# Altium footprint library NXP_60_26022015.PCBLIB: 287 footprints (part 14 of 18)
Each footprint in its own frame and in the unit in brackets; x right, y up, seen from the top. Pads: shape width x height; smd on the part's side, far side on the other; paste and mask are expansions set on the pad; w line width, h text height; cw(c..) or ccw(c..) is an arc to the next point about the centre after c.
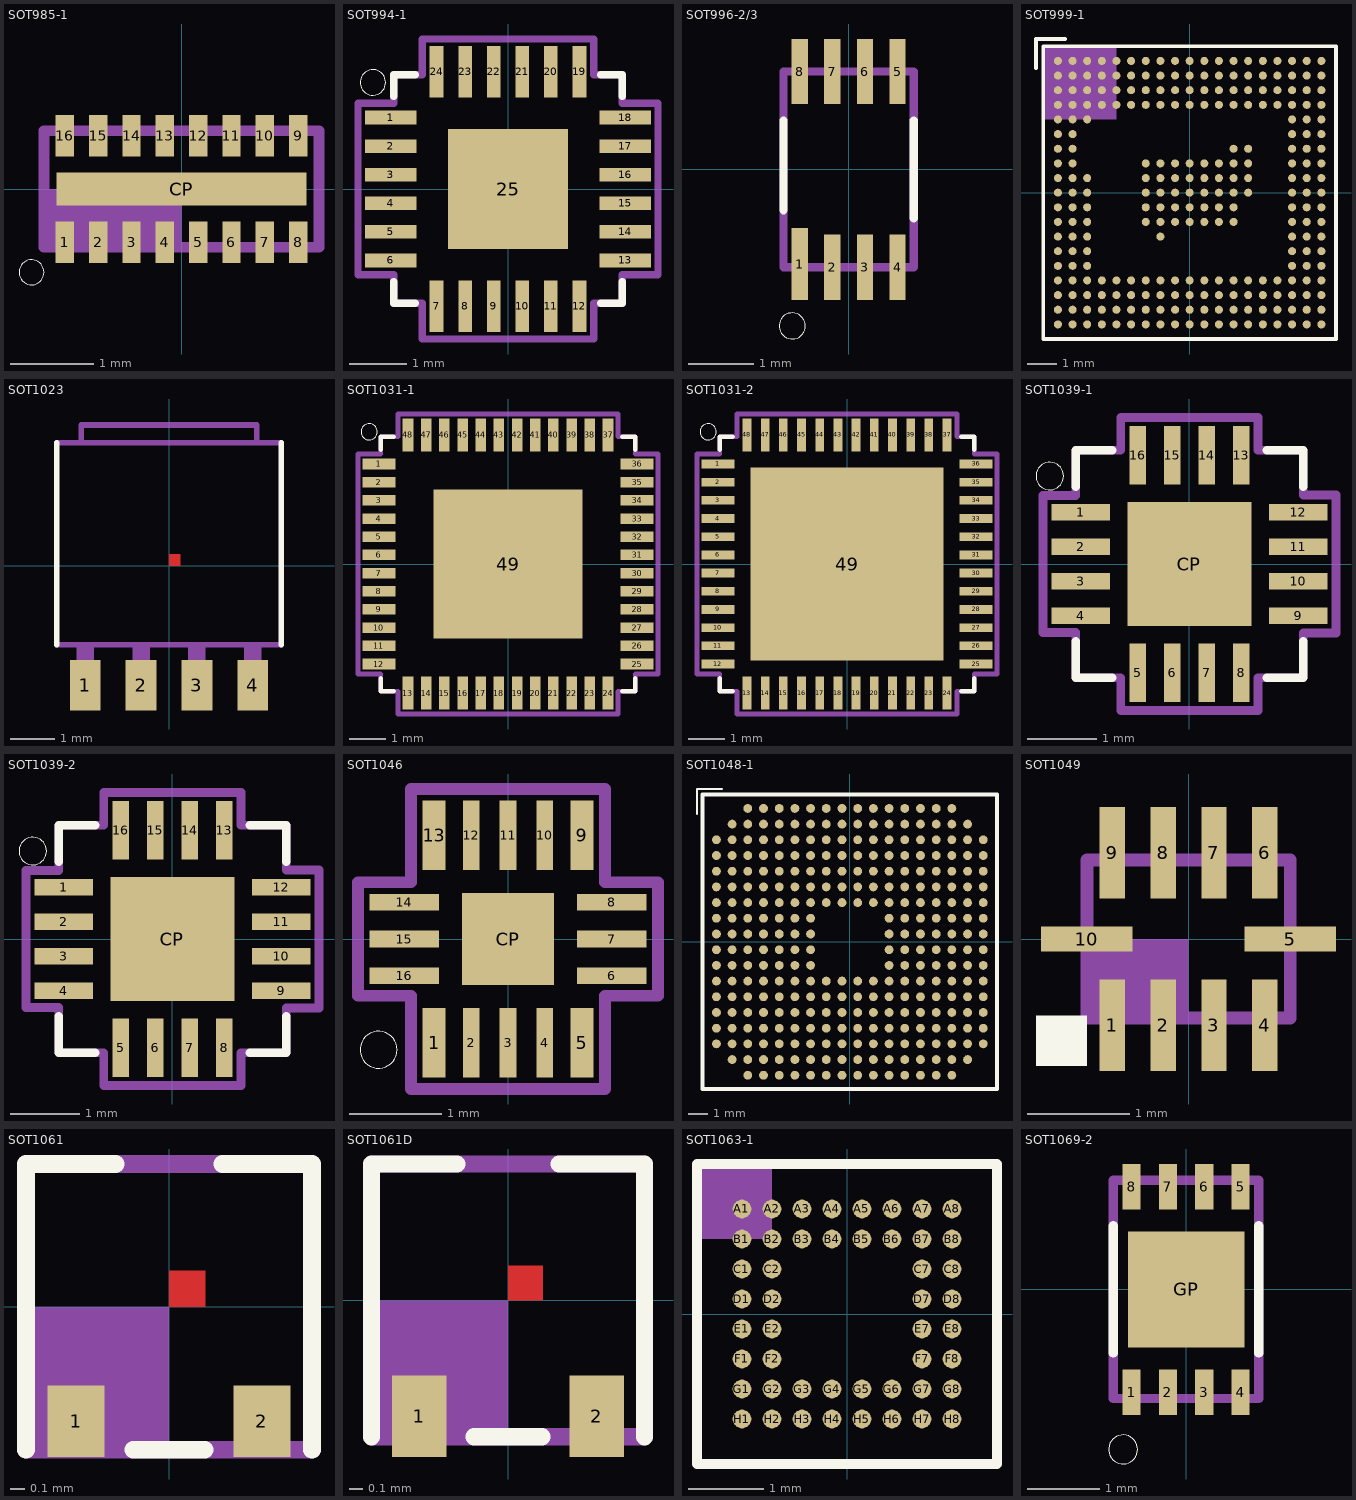
[diagram p13: the footprints below, top view; thin cyan lines are the x and y axes]

## SOT985-1 [mm]
pads (17):
  rect 0.22x0.5 smd: 1(-1.4,-0.64) 2(-1,-0.64) 3(-0.6,-0.64) 4(-0.2,-0.64) 5(0.2,-0.64) 6(0.6,-0.64) 7(1,-0.64) 8(1.4,-0.64) 9(1.4,0.64) 10(1,0.64) 11(0.6,0.64) 12(0.2,0.64) 13(-0.2,0.64) 14(-0.6,0.64) 15(-1,0.64) 16(-1.4,0.64)
  rect 3x0.4 smd: CP(0,0)
Top Overlay:
  circle w0: c-1.8,-1 r0.15
Top Paste:
  rectangle: -0.175,-0.15 0.175,0.15
  rectangle: -1.175,-0.15 -0.825,0.15
  rectangle: 0.825,-0.15 1.175,0.15
Top Solder:
  rectangle: -1.56,-0.94 1.56,-0.34
  rectangle: -1.56,0.34 1.56,0.94
  rectangle: -1.55,-0.25 1.55,0.25
Mechanical 16:
  rectangle: -1.65,-0.7 0,0
  lines w0.127: -1.65,-0.7 -1.65,0.7 1.65,0.7 1.65,-0.7 -1.65,-0.7

## SOT994-1 [mm]
pads (25):
  rect 0.9x0.24 smd: 1(-2.05,1.25) 2(-2.05,0.75) 3(-2.05,0.25) 4(-2.05,-0.25) 5(-2.05,-0.75) 6(-2.05,-1.25) 13(2.05,-1.25) 14(2.05,-0.75) 15(2.05,-0.25) 16(2.05,0.25) 17(2.05,0.75) 18(2.05,1.25)
  rect 0.24x0.9 smd: 7(-1.25,-2.05) 8(-0.75,-2.05) 9(-0.25,-2.05) 10(0.25,-2.05) 11(0.75,-2.05) 12(1.25,-2.05) 19(1.25,2.05) 20(0.75,2.05) 21(0.25,2.05) 22(-0.25,2.05) 23(-0.75,2.05) 24(-1.25,2.05)
  rect 2.1x2.1 smd: 25(0,0)
Top Overlay:
  circle w0: c-2.365,1.865 r0.224
  lines w0.127: -2,-1.625 -2,-2 -1.625,-2 ; -2,1.625 -2,2 -1.625,2 ; 1.625,-2 2,-2 2,-1.625 ; 1.625,2 2,2 2,1.625
Top Paste:
  rectangle: -0.6,0.15 -0.15,0.6
  rectangle: 0.15,0.15 0.6,0.6
  rectangle: 0.15,-0.6 0.6,-0.15
  rectangle: -0.6,-0.6 -0.15,-0.15
Mechanical 16:
  lines w0.127: -2.625,-1.5 -2.625,1.5 -2,1.5 -2,2 -1.5,2 -1.5,2.625 1.5,2.625 1.5,2 2,2 2,1.5 2.625,1.5 2.625,-1.5 2,-1.5 2,-2 1.5,-2 1.5,-2.625 -1.5,-2.625 -1.5,-2 -2,-2 -2,-1.5 -2.625,-1.5
  text "SOT994-1" at -0.7,-1 h0.17

## SOT996-2/3 [mm]
pads (8):
  rect 0.25x1.1 smd: 1(-0.75,-1.45)
  rect 0.25x1 smd: 2(-0.25,-1.5) 3(0.25,-1.5) 4(0.75,-1.5) 5(0.75,1.5) 6(0.25,1.5) 7(-0.25,1.5) 8(-0.75,1.5)
Top Overlay:
  circle w0: c-0.865,-2.4 r0.2
  lines w0.127: -1,-0.625 -1,0.75 ; 1,-0.75 1,0.75
Top Paste:
  rectangle: 0.15,1.025 0.35,1.975
  rectangle: -0.35,1.025 -0.15,1.975
  rectangle: -0.85,1.025 -0.65,1.975
  rectangle: 0.65,1.025 0.85,1.975
  rectangle: 0.65,-1.975 0.85,-1.025
  rectangle: 0.15,-1.975 0.35,-1.025
  rectangle: -0.35,-1.975 -0.15,-1.025
  rectangle: -0.85,-1.975 -0.65,-0.925
Mechanical 16:
  lines w0.127: -1,-1.5 1,-1.5 1,1.5 -1,1.5 -1,-1.5
  text "SOT996-2/3" at 3.04,-1.145 h0.17

## SOT999-1 [mm]
pads (256):
  rrect100% 0.275x0.275 smd: A1(-4.5,4.5) A2(-4,4.5) A3(-3.5,4.5) A4(-3,4.5) A5(-2.5,4.5) A6(-2,4.5) A7(-1.5,4.5) A8(-1,4.5) A9(-0.5,4.5) A10(0,4.5) A11(0.5,4.5) A12(1,4.5) A13(1.5,4.5) A14(2,4.5) A15(2.5,4.5) A16(3,4.5) A17(3.5,4.5) A18(4,4.5) A19(4.5,4.5) B1(-4.5,4) B2(-4,4) B3(-3.5,4) B4(-3,4) B5(-2.5,4) B6(-2,4) B7(-1.5,4) B8(-1,4) B9(-0.5,4) B10(0,4) B11(0.5,4) B12(1,4) B13(1.5,4) B14(2,4) B15(2.5,4) B16(3,4) B17(3.5,4) B18(4,4) B19(4.5,4) C1(-4.5,3.5) C2(-4,3.5) C3(-3.5,3.5) C4(-3,3.5) C5(-2.5,3.5) C6(-2,3.5) C7(-1.5,3.5) C8(-1,3.5) C9(-0.5,3.5) C10(0,3.5) C11(0.5,3.5) C12(1,3.5) C13(1.5,3.5) C14(2,3.5) C15(2.5,3.5) C16(3,3.5) C17(3.5,3.5) C18(4,3.5) C19(4.5,3.5) D1(-4.5,3) D2(-4,3) D3(-3.5,3) D4(-3,3) D5(-2.5,3) D6(-2,3) D7(-1.5,3) D8(-1,3) D9(-0.5,3) D10(0,3) D11(0.5,3) D12(1,3) D13(1.5,3) D14(2,3) D15(2.5,3) D16(3,3) D17(3.5,3) D18(4,3) D19(4.5,3) E1(-4.5,2.5) E2(-4,2.5) E3(-3.5,2.5) E17(3.5,2.5) E18(4,2.5) E19(4.5,2.5) F1(-4.5,2) F2(-4,2) F17(3.5,2) F18(4,2) F19(4.5,2) G1(-4.5,1.5) G2(-4,1.5) G13(1.5,1.5) G14(2,1.5) G17(3.5,1.5) G18(4,1.5) G19(4.5,1.5) H1(-4.5,1) H2(-4,1) H7(-1.5,1) H8(-1,1) H9(-0.5,1) H10(0,1) H11(0.5,1) H12(1,1) H13(1.5,1) H14(2,1) H17(3.5,1) H18(4,1) H19(4.5,1) J1(-4.5,0.5) J2(-4,0.5) J3(-3.5,0.5) J7(-1.5,0.5) J8(-1,0.5) J9(-0.5,0.5) J10(0,0.5) J11(0.5,0.5) J12(1,0.5) J13(1.5,0.5) J14(2,0.5) J17(3.5,0.5) J18(4,0.5) J19(4.5,0.5) K1(-4.5,0) K2(-4,0) K3(-3.5,0) K7(-1.5,0) K8(-1,0) K9(-0.5,0) K10(0,0) K11(0.5,0) K12(1,0) K13(1.5,0) K14(2,0) K17(3.5,0) K18(4,0) K19(4.5,0) L1(-4.5,-0.5) L2(-4,-0.5) L3(-3.5,-0.5) L7(-1.5,-0.5) L8(-1,-0.5) L9(-0.5,-0.5) L10(0,-0.5) L11(0.5,-0.5) L12(1,-0.5) L13(1.5,-0.5) L17(3.5,-0.5) L18(4,-0.5) L19(4.5,-0.5) M1(-4.5,-1) M2(-4,-1) M3(-3.5,-1) M7(-1.5,-1) M8(-1,-1) M9(-0.5,-1) M10(0,-1) M11(0.5,-1) M12(1,-1) M13(1.5,-1) M17(3.5,-1) M18(4,-1) M19(4.5,-1) N1(-4.5,-1.5) N2(-4,-1.5) N3(-3.5,-1.5) N8(-1,-1.5) N17(3.5,-1.5) N18(4,-1.5) N19(4.5,-1.5) P1(-4.5,-2) P2(-4,-2) P3(-3.5,-2) P17(3.5,-2) P18(4,-2) P19(4.5,-2) R1(-4.5,-2.5) R2(-4,-2.5) R3(-3.5,-2.5) R17(3.5,-2.5) R18(4,-2.5) R19(4.5,-2.5) T1(-4.5,-3) T2(-4,-3) T3(-3.5,-3) T4(-3,-3) T5(-2.5,-3) T6(-2,-3) T7(-1.5,-3) T8(-1,-3) T9(-0.5,-3) T10(0,-3) T11(0.5,-3) T12(1,-3) T13(1.5,-3) T14(2,-3) T15(2.5,-3) T16(3,-3) T17(3.5,-3) T18(4,-3) T19(4.5,-3) U1(-4.5,-3.5) U2(-4,-3.5) U3(-3.5,-3.5) U4(-3,-3.5) U5(-2.5,-3.5) U6(-2,-3.5) U7(-1.5,-3.5) U8(-1,-3.5) U9(-0.5,-3.5) U10(0,-3.5) U11(0.5,-3.5) U12(1,-3.5) U13(1.5,-3.5) U14(2,-3.5) U15(2.5,-3.5) U16(3,-3.5) U17(3.5,-3.5) U18(4,-3.5) U19(4.5,-3.5) V1(-4.5,-4) V2(-4,-4) V3(-3.5,-4) V4(-3,-4) V5(-2.5,-4) V6(-2,-4) V7(-1.5,-4) V8(-1,-4) V9(-0.5,-4) V10(0,-4) V11(0.5,-4) V12(1,-4) V13(1.5,-4) V14(2,-4) V15(2.5,-4) V16(3,-4) V17(3.5,-4) V18(4,-4) V19(4.5,-4) W1(-4.5,-4.5) W2(-4,-4.5) W3(-3.5,-4.5) W4(-3,-4.5) W5(-2.5,-4.5) W6(-2,-4.5) W7(-1.5,-4.5) W8(-1,-4.5) W9(-0.5,-4.5) W10(0,-4.5) W11(0.5,-4.5) W12(1,-4.5) W13(1.5,-4.5) W14(2,-4.5) W15(2.5,-4.5) W16(3,-4.5) W17(3.5,-4.5) W18(4,-4.5) W19(4.5,-4.5)
Top Overlay:
  lines w0.127: -5.25,4.25 -5.25,5.25 -4.25,5.25 ; -5,-5 5,-5 5,5 -5,5 -5,-5
Top Paste:
  drawing of 256 lines, arcs and shapes, not listed
Top Solder:
  drawing of 256 lines, arcs and shapes, not listed
Mechanical 16:
  rectangle: -5,2.5 -2.5,5

## SOT1023 [mm]
pads (5):
  rect 0.7x1.15 smd: 1(-1.905,-2.725) 2(-0.635,-2.725) 3(0.635,-2.725) 4(1.905,-2.725)
  rect 0x0 smd: MB(0,0)
Top Layer:
  region: 0,0 0.254,0 0.254,0.254 0,0.254
Top Overlay:
  lines w0.127: -2.55,-1.8 -2.55,2.8 ; 2.55,-1.8 2.55,2.8
Top Paste:
  rectangle: -0.45,0 0.45,0.6
  rectangle: -1.6,0 -0.7,0.6
  rectangle: 0.7,0 1.6,0.6
  rectangle: -1.6,-0.85 -0.7,-0.25
  rectangle: -0.45,-0.85 0.45,-0.25
  rectangle: 0.7,-0.85 1.6,-0.25
  rectangle: 0.7,0.85 1.6,1.45
  rectangle: -0.45,0.85 0.45,1.45
  rectangle: -1.6,0.85 -0.7,1.45
  rectangle: 0.335,-3.25 0.935,-2.2
  rectangle: -0.935,-3.25 -0.335,-2.2
  rectangle: -2.205,-3.25 -1.605,-2.2
  rectangle: 1.605,-3.25 2.205,-2.2
  rectangle: -0.925,2.55 -0.325,3.45
  rectangle: 0.325,2.55 0.925,3.45
  rectangle: 1.575,2.55 2.175,3.45
  rectangle: -2.175,2.55 -1.575,3.45
Top Solder:
  rectangle: -1.06,-3.375 -0.21,-2.075
  rectangle: -2.33,-3.375 -1.48,-2.075
  rectangle: 0.21,-3.375 1.06,-2.075
  rectangle: 1.48,-3.375 2.33,-2.075
  region: 0,0 0.254,0 0.254,0.254 0,0.254
Mechanical 16:
  rectangle: -0.835,-2.8 -0.435,-1.8
  rectangle: -2.105,-2.8 -1.705,-1.8
  rectangle: 0.435,-2.8 0.835,-1.8
  rectangle: 1.705,-2.8 2.105,-1.8
  lines w0.127: -2.55,-1.8 2.55,-1.8 ; -2.55,2.8 -2,2.8 ; 2.55,2.8 2,2.8 ; -2,2.8 2,2.8 ; -2,2.8 -2,3.2 2,3.2 2,2.8
  text "SOT1023" at 0.635,-1.27 h0.17

## SOT1031-1 [mm]
pads (49):
  rect 0.9x0.29 smd: 1(-3.55,2.75) 2(-3.55,2.25) 3(-3.55,1.75) 4(-3.55,1.25) 5(-3.55,0.75) 6(-3.55,0.25) 7(-3.55,-0.25) 8(-3.55,-0.75) 9(-3.55,-1.25) 10(-3.55,-1.75) 11(-3.55,-2.25) 12(-3.55,-2.75) 25(3.55,-2.75) 26(3.55,-2.25) 27(3.55,-1.75) 28(3.55,-1.25) 29(3.55,-0.75) 30(3.55,-0.25) 31(3.55,0.25) 32(3.55,0.75) 33(3.55,1.25) 34(3.55,1.75) 35(3.55,2.25) 36(3.55,2.75)
  rect 0.29x0.9 smd: 13(-2.75,-3.55) 14(-2.25,-3.55) 15(-1.75,-3.55) 16(-1.25,-3.55) 17(-0.75,-3.55) 18(-0.25,-3.55) 19(0.25,-3.55) 20(0.75,-3.55) 21(1.25,-3.55) 22(1.75,-3.55) 23(2.25,-3.55) 24(2.75,-3.55) 37(2.75,3.55) 38(2.25,3.55) 39(1.75,3.55) 40(1.25,3.55) 41(0.75,3.55) 42(0.25,3.55) 43(-0.25,3.55) 44(-0.75,3.55) 45(-1.25,3.55) 46(-1.75,3.55) 47(-2.25,3.55) 48(-2.75,3.55)
  rect 4.1x4.1 smd: 49(0,0)
Top Overlay:
  circle w0: c-3.818,3.635 r0.224
  lines w0.127: -3.5,-3.15 -3.5,-3.5 -3.15,-3.5 ; -3.5,3.15 -3.5,3.5 -3.15,3.5 ; 3.15,-3.5 3.5,-3.5 3.5,-3.15 ; 3.15,3.5 3.5,3.5 3.5,3.15
Top Paste:
  rectangle: -0.3,-0.3 0.3,0.3
  rectangle: 0.6,-0.3 1.2,0.3
  rectangle: -1.2,-0.3 -0.6,0.3
  rectangle: -1.2,0.6 -0.6,1.2
  rectangle: -0.3,0.6 0.3,1.2
  rectangle: 0.6,0.6 1.2,1.2
  rectangle: -1.2,-1.2 -0.6,-0.6
  rectangle: -0.3,-1.2 0.3,-0.6
  rectangle: 0.6,-1.2 1.2,-0.6
Mechanical 16:
  lines w0.127: -4.125,-3.025 -4.125,3.025 -3.5,3.025 -3.5,3.5 -3.025,3.5 -3.025,4.125 3.025,4.125 3.025,3.5 3.5,3.5 3.5,3.025 4.125,3.025 4.125,-3.025 3.5,-3.025 3.5,-3.5 3.025,-3.5 3.025,-4.125 -3.025,-4.125 -3.025,-3.5 -3.5,-3.5 -3.5,-3.025 -4.125,-3.025
  text "SOT1031-1" at -0.75,-2.625 h0.17

## SOT1031-2 [mm]
pads (49):
  rect 0.9x0.24 smd: 1(-3.55,2.75) 2(-3.55,2.25) 3(-3.55,1.75) 4(-3.55,1.25) 5(-3.55,0.75) 6(-3.55,0.25) 7(-3.55,-0.25) 8(-3.55,-0.75) 9(-3.55,-1.25) 10(-3.55,-1.75) 11(-3.55,-2.25) 12(-3.55,-2.75) 25(3.55,-2.75) 26(3.55,-2.25) 27(3.55,-1.75) 28(3.55,-1.25) 29(3.55,-0.75) 30(3.55,-0.25) 31(3.55,0.25) 32(3.55,0.75) 33(3.55,1.25) 34(3.55,1.75) 35(3.55,2.25) 36(3.55,2.75)
  rect 0.24x0.9 smd: 13(-2.75,-3.55) 14(-2.25,-3.55) 15(-1.75,-3.55) 16(-1.25,-3.55) 17(-0.75,-3.55) 18(-0.25,-3.55) 19(0.25,-3.55) 20(0.75,-3.55) 21(1.25,-3.55) 22(1.75,-3.55) 23(2.25,-3.55) 24(2.75,-3.55) 37(2.75,3.55) 38(2.25,3.55) 39(1.75,3.55) 40(1.25,3.55) 41(0.75,3.55) 42(0.25,3.55) 43(-0.25,3.55) 44(-0.75,3.55) 45(-1.25,3.55) 46(-1.75,3.55) 47(-2.25,3.55) 48(-2.75,3.55)
  rect 5.3x5.3 smd: 49(0,0)
Top Overlay:
  circle w0: c-3.818,3.635 r0.224
  lines w0.127: -3.5,-3.15 -3.5,-3.5 -3.15,-3.5 ; -3.5,3.15 -3.5,3.5 -3.15,3.5 ; 3.15,-3.5 3.5,-3.5 3.5,-3.15 ; 3.15,3.5 3.5,3.5 3.5,3.15
Top Paste:
  rectangle: -0.375,-0.375 0.375,0.375
  rectangle: -1.5,-0.375 -0.75,0.375
  rectangle: -1.5,0.75 -0.75,1.5
  rectangle: -0.375,0.75 0.375,1.5
  rectangle: 0.75,0.75 1.5,1.5
  rectangle: 0.75,-0.375 1.5,0.375
  rectangle: 0.75,-1.5 1.5,-0.75
  rectangle: -0.375,-1.5 0.375,-0.75
  rectangle: -1.5,-1.5 -0.75,-0.75
Mechanical 16:
  lines w0.127: -4.125,-3.025 -4.125,3.025 -3.5,3.025 -3.5,3.5 -3.025,3.5 -3.025,4.125 3.025,4.125 3.025,3.5 3.5,3.5 3.5,3.025 4.125,3.025 4.125,-3.025 3.5,-3.025 3.5,-3.5 3.025,-3.5 3.025,-4.125 -3.025,-4.125 -3.025,-3.5 -3.5,-3.5 -3.5,-3.025 -4.125,-3.025
  text "SOT1031-2" at -0.75,-2.25 h0.17

## SOT1039-1 [mm]
pads (17):
  rect 0.85x0.24 smd: 1(-1.575,0.75) 2(-1.575,0.25) 3(-1.575,-0.25) 4(-1.575,-0.75) 9(1.575,-0.75) 10(1.575,-0.25) 11(1.575,0.25) 12(1.575,0.75)
  rect 0.24x0.85 smd: 5(-0.75,-1.575) 6(-0.25,-1.575) 7(0.25,-1.575) 8(0.75,-1.575) 13(0.75,1.575) 14(0.25,1.575) 15(-0.25,1.575) 16(-0.75,1.575)
  rect 1.8x1.8 smd: CP(0,0)
Top Overlay:
  circle w0: c-2.025,1.275 r0.2
  lines w0.127: -1.65,-1.12 -1.65,-1.65 -1.12,-1.65 ; -1.65,1.12 -1.65,1.65 -1.12,1.65 ; 1.12,-1.65 1.65,-1.65 1.65,-1.125 ; 1.12,1.65 1.65,1.65 1.65,1.125
Top Paste:
  rectangle: -0.4,-0.4 0.4,0.4
  rectangle: 1.163,0.142 1.988,0.357
  rectangle: 0.142,1.163 0.357,1.988
  rectangle: 0.142,-1.988 0.357,-1.163
  rectangle: -0.357,-1.988 -0.142,-1.163
  rectangle: -0.858,-1.988 -0.643,-1.163
  rectangle: 0.643,-1.988 0.858,-1.163
  rectangle: 0.643,1.163 0.858,1.988
  rectangle: -0.357,1.163 -0.142,1.988
  rectangle: -0.858,1.163 -0.643,1.988
  rectangle: -1.988,0.142 -1.163,0.357
  rectangle: -1.988,0.643 -1.163,0.858
  rectangle: -1.988,-0.357 -1.163,-0.142
  rectangle: -1.988,-0.858 -1.163,-0.643
  rectangle: 1.163,-0.357 1.988,-0.142
  rectangle: 1.163,-0.858 1.988,-0.643
  rectangle: 1.163,0.643 1.988,0.858
Top Solder:
  region: 0,0 0.254,0 0.254,0.254 0,0.254
Mechanical 16:
  lines w0.127: -2.125,-0.995 -1.65,-0.995 -1.65,-1.65 -0.995,-1.65 -0.995,-2.125 0.995,-2.125 0.995,-1.65 1.65,-1.65 1.65,-1 2.125,-1 2.125,1 1.65,1 1.65,1.65 0.995,1.65 0.995,2.125 -0.995,2.125 -0.995,1.65 -1.65,1.65 -1.65,0.995 -2.125,0.995 -2.125,-0.995
  text "SOT1039-1" at -0.625,-2.625 h0.17

## SOT1039-2 [mm]
pads (17):
  rect 0.85x0.24 smd: 1(-1.575,0.75) 2(-1.575,0.25) 3(-1.575,-0.25) 4(-1.575,-0.75) 9(1.575,-0.75) 10(1.575,-0.25) 11(1.575,0.25) 12(1.575,0.75)
  rect 0.24x0.85 smd: 5(-0.75,-1.575) 6(-0.25,-1.575) 7(0.25,-1.575) 8(0.75,-1.575) 13(0.75,1.575) 14(0.25,1.575) 15(-0.25,1.575) 16(-0.75,1.575)
  rect 1.8x1.8 smd: CP(0,0)
Top Overlay:
  circle w0: c-2.025,1.275 r0.2
  lines w0.127: -1.65,-1.12 -1.65,-1.65 -1.12,-1.65 ; -1.65,1.12 -1.65,1.65 -1.12,1.65 ; 1.12,-1.65 1.65,-1.65 1.65,-1.125 ; 1.12,1.65 1.65,1.65 1.65,1.125
Top Paste:
  rectangle: -0.4,-0.4 0.4,0.4
  rectangle: 1.163,0.142 1.988,0.357
  rectangle: 0.142,1.163 0.357,1.988
  rectangle: 0.142,-1.988 0.357,-1.163
  rectangle: -0.357,-1.988 -0.142,-1.163
  rectangle: -0.858,-1.988 -0.643,-1.163
  rectangle: 0.643,-1.988 0.858,-1.163
  rectangle: 0.643,1.163 0.858,1.988
  rectangle: -0.357,1.163 -0.142,1.988
  rectangle: -0.858,1.163 -0.643,1.988
  rectangle: -1.988,0.142 -1.163,0.357
  rectangle: -1.988,0.643 -1.163,0.858
  rectangle: -1.988,-0.357 -1.163,-0.142
  rectangle: -1.988,-0.858 -1.163,-0.643
  rectangle: 1.163,-0.357 1.988,-0.142
  rectangle: 1.163,-0.858 1.988,-0.643
  rectangle: 1.163,0.643 1.988,0.858
Top Solder:
  region: 0,0 0.254,0 0.254,0.254 0,0.254
Mechanical 16:
  lines w0.127: -2.125,-0.995 -1.65,-0.995 -1.65,-1.65 -0.995,-1.65 -0.995,-2.125 0.995,-2.125 0.995,-1.65 1.65,-1.65 1.65,-1 2.125,-1 2.125,1 1.65,1 1.65,1.65 0.995,1.65 0.995,2.125 -0.995,2.125 -0.995,1.65 -1.65,1.65 -1.65,0.995 -2.125,0.995 -2.125,-0.995
  text "SOT1039-2" at -0.625,-2.625 h0.17

## SOT1046 [mil]
pads (17):
  rect 9.84x29.53 smd: 1(-31.5,-44.29) 5(31.5,-44.29) 9(31.5,44.29) 13(-31.5,44.29)
  rect 7.09x29.53 smd: 2(-15.75,-44.29) 3(0,-44.29) 4(15.75,-44.29) 10(15.75,44.29) 11(0,44.29) 12(-15.75,44.29)
  rect 29.53x7.09 smd: 6(44.29,-15.75) 7(44.29,0) 8(44.29,15.75) 14(-44.29,15.75) 15(-44.29,0) 16(-44.29,-15.75)
  rect 39.37x39.37 smd: CP(0,0)
Top Overlay:
  circle w0: c-55.12,-47.24 r7.87
Top Paste:
  rectangle: -7.87,-7.87 7.87,7.87
  rectangle: -35.43,30.51 -27.56,58.07
  rectangle: 27.56,30.51 35.43,58.07
  rectangle: -35.43,-58.07 -27.56,-30.51
  rectangle: 27.56,-58.07 35.43,-30.51
Mechanical 16:
  lines w5: -63.98,-24.21 -63.98,24.21 -41.34,24.21 -41.34,63.98 41.34,63.98 41.34,24.21 63.98,24.21 63.98,-24.21 41.34,-24.21 41.34,-63.98 -41.34,-63.98 -41.34,-24.21 -63.98,-24.21
  text "SOT1046" at -24.61,-78.74 h6.69

## SOT1048-1 [mm]
pads (296):
  rrect100% 0.45x0.45 smd: A3(-5.2,6.8) A4(-4.4,6.8) A5(-3.6,6.8) A6(-2.8,6.8) A7(-2,6.8) A8(-1.2,6.8) A9(-0.4,6.8) A10(0.4,6.8) A11(1.2,6.8) A12(2,6.8) A13(2.8,6.8) A14(3.6,6.8) A15(4.4,6.8) A16(5.2,6.8) B2(-6,6) B3(-5.2,6) B4(-4.4,6) B5(-3.6,6) B6(-2.8,6) B7(-2,6) B8(-1.2,6) B9(-0.4,6) B10(0.4,6) B11(1.2,6) B12(2,6) B13(2.8,6) B14(3.6,6) B15(4.4,6) B16(5.2,6) B17(6,6) C1(-6.8,5.2) C2(-6,5.2) C3(-5.2,5.2) C4(-4.4,5.2) C5(-3.6,5.2) C6(-2.8,5.2) C7(-2,5.2) C8(-1.2,5.2) C9(-0.4,5.2) C10(0.4,5.2) C11(1.2,5.2) C12(2,5.2) C13(2.8,5.2) C14(3.6,5.2) C15(4.4,5.2) C16(5.2,5.2) C17(6,5.2) C18(6.8,5.2) D1(-6.8,4.4) D2(-6,4.4) D3(-5.2,4.4) D4(-4.4,4.4) D5(-3.6,4.4) D6(-2.8,4.4) D7(-2,4.4) D8(-1.2,4.4) D9(-0.4,4.4) D10(0.4,4.4) D11(1.2,4.4) D12(2,4.4) D13(2.8,4.4) D14(3.6,4.4) D15(4.4,4.4) D16(5.2,4.4) D17(6,4.4) D18(6.8,4.4) E1(-6.8,3.6) E2(-6,3.6) E3(-5.2,3.6) E4(-4.4,3.6) E5(-3.6,3.6) E6(-2.8,3.6) E7(-2,3.6) E8(-1.2,3.6) E9(-0.4,3.6) E10(0.4,3.6) E11(1.2,3.6) E12(2,3.6) E13(2.8,3.6) E14(3.6,3.6) E15(4.4,3.6) E16(5.2,3.6) E17(6,3.6) E18(6.8,3.6) F1(-6.8,2.8) F2(-6,2.8) F3(-5.2,2.8) F4(-4.4,2.8) F5(-3.6,2.8) F6(-2.8,2.8) F7(-2,2.8) F8(-1.2,2.8) F9(-0.4,2.8) F10(0.4,2.8) F11(1.2,2.8) F12(2,2.8) F13(2.8,2.8) F14(3.6,2.8) F15(4.4,2.8) F16(5.2,2.8) F17(6,2.8) F18(6.8,2.8) G1(-6.8,2) G2(-6,2) G3(-5.2,2) G4(-4.4,2) G5(-3.6,2) G6(-2.8,2) G7(-2,2) G8(-1.2,2) G9(-0.4,2) G10(0.4,2) G11(1.2,2) G12(2,2) G13(2.8,2) G14(3.6,2) G15(4.4,2) G16(5.2,2) G17(6,2) G18(6.8,2) H1(-6.8,1.2) H2(-6,1.2) H3(-5.2,1.2) H4(-4.4,1.2) H5(-3.6,1.2) H6(-2.8,1.2) H7(-2,1.2) H12(2,1.2) H13(2.8,1.2) H14(3.6,1.2) H15(4.4,1.2) H16(5.2,1.2) H17(6,1.2) H18(6.8,1.2) J1(-6.8,0.4) J2(-6,0.4) J3(-5.2,0.4) J4(-4.4,0.4) J5(-3.6,0.4) J6(-2.8,0.4) J7(-2,0.4) J12(2,0.4) J13(2.8,0.4) J14(3.6,0.4) J15(4.4,0.4) J16(5.2,0.4) J17(6,0.4) J18(6.8,0.4) K1(-6.8,-0.4) K2(-6,-0.4) K3(-5.2,-0.4) K4(-4.4,-0.4) K5(-3.6,-0.4) K6(-2.8,-0.4) K7(-2,-0.4) K12(2,-0.4) K13(2.8,-0.4) K14(3.6,-0.4) K15(4.4,-0.4) K16(5.2,-0.4) K17(6,-0.4) K18(6.8,-0.4) L1(-6.8,-1.2) L2(-6,-1.2) L3(-5.2,-1.2) L4(-4.4,-1.2) L5(-3.6,-1.2) L6(-2.8,-1.2) L7(-2,-1.2) L12(2,-1.2) L13(2.8,-1.2) L14(3.6,-1.2) L15(4.4,-1.2) L16(5.2,-1.2) L17(6,-1.2) L18(6.8,-1.2) M1(-6.8,-2) M2(-6,-2) M3(-5.2,-2) M4(-4.4,-2) M5(-3.6,-2) M6(-2.8,-2) M7(-2,-2) M8(-1.2,-2) M9(-0.4,-2) M10(0.4,-2) M11(1.2,-2) M12(2,-2) M13(2.8,-2) M14(3.6,-2) M15(4.4,-2) M16(5.2,-2) M17(6,-2) M18(6.8,-2) N1(-6.8,-2.8) N2(-6,-2.8) N3(-5.2,-2.8) N4(-4.4,-2.8) N5(-3.6,-2.8) N6(-2.8,-2.8) N7(-2,-2.8) N8(-1.2,-2.8) N9(-0.4,-2.8) N10(0.4,-2.8) N11(1.2,-2.8) N12(2,-2.8) N13(2.8,-2.8) N14(3.6,-2.8) N15(4.4,-2.8) N16(5.2,-2.8) N17(6,-2.8) N18(6.8,-2.8) P1(-6.8,-3.6) P2(-6,-3.6) P3(-5.2,-3.6) P4(-4.4,-3.6) P5(-3.6,-3.6) P6(-2.8,-3.6) P7(-2,-3.6) P8(-1.2,-3.6) P9(-0.4,-3.6) P10(0.4,-3.6) P11(1.2,-3.6) P12(2,-3.6) P13(2.8,-3.6) P14(3.6,-3.6) P15(4.4,-3.6) P16(5.2,-3.6) P17(6,-3.6) P18(6.8,-3.6) R1(-6.8,-4.4) R2(-6,-4.4) R3(-5.2,-4.4) R4(-4.4,-4.4) R5(-3.6,-4.4) R6(-2.8,-4.4) R7(-2,-4.4) R8(-1.2,-4.4) R9(-0.4,-4.4) R10(0.4,-4.4) R11(1.2,-4.4) R12(2,-4.4) R13(2.8,-4.4) R14(3.6,-4.4) R15(4.4,-4.4) R16(5.2,-4.4) R17(6,-4.4) R18(6.8,-4.4) T1(-6.8,-5.2) T2(-6,-5.2) T3(-5.2,-5.2) T4(-4.4,-5.2) T5(-3.6,-5.2) T6(-2.8,-5.2) T7(-2,-5.2) T8(-1.2,-5.2) T9(-0.4,-5.2) T10(0.4,-5.2) T11(1.2,-5.2) T12(2,-5.2) T13(2.8,-5.2) T14(3.6,-5.2) T15(4.4,-5.2) T16(5.2,-5.2) T17(6,-5.2) T18(6.8,-5.2) U2(-6,-6) U3(-5.2,-6) U4(-4.4,-6) U5(-3.6,-6) U6(-2.8,-6) U7(-2,-6) U8(-1.2,-6) U9(-0.4,-6) U10(0.4,-6) U11(1.2,-6) U12(2,-6) U13(2.8,-6) U14(3.6,-6) U15(4.4,-6) U16(5.2,-6) U17(6,-6) V3(-5.2,-6.8) V4(-4.4,-6.8) V5(-3.6,-6.8) V6(-2.8,-6.8) V7(-2,-6.8) V8(-1.2,-6.8) V9(-0.4,-6.8) V10(0.4,-6.8) V11(1.2,-6.8) V12(2,-6.8) V13(2.8,-6.8) V14(3.6,-6.8) V15(4.4,-6.8) V16(5.2,-6.8)
Top Overlay:
  lines w0.127: -7.79,6.54 -7.79,7.79 -6.54,7.79
  lines w0.203: -7.5,-7.5 7.5,-7.5 7.5,7.5 -7.5,7.5 -7.5,-7.5

## SOT1049 [mm]
pads (10):
  rect 0.25x0.9 smd: 1(-0.75,-0.85) 2(-0.25,-0.85) 3(0.25,-0.85) 4(0.75,-0.85) 6(0.75,0.85) 7(0.25,0.85) 8(-0.25,0.85) 9(-0.75,0.85)
  rect 0.9x0.25 smd: 5(1,0) 10(-1,0)
Top Overlay:
  rectangle: -1.5,-1.25 -1,-0.75
Mechanical 16:
  rectangle: -1,-0.775 0,0
  lines w0.127: -1,-0.775 1,-0.775 1,0.775 -1,0.775 -1,-0.775

## SOT1061 [mm]
pads (3):
  rect 0.4x0.5 smd: 1(-0.65,-0.8) 2(0.65,-0.8)
  rect 0x0 smd: 3(0,0.875)
Top Layer:
  region: 0,0 0.254,0 0.254,0.254 0,0.254
Top Overlay:
  lines w0.125: -1,-1 -1,1 -0.375,1 ; -0.25,-1 0.25,-1 ; 0.375,1 1,1 1,-1
Top Paste:
  region: 0,0 0.254,0 0.254,0.254 0,0.254
Top Solder:
  region: -0.4,-0.5 -0.9,-0.5 -0.9,-1.1 -0.4,-1.1
  region: 0.9,-0.5 0.4,-0.5 0.4,-1.1 0.9,-1.1
  region: 0,0 0.254,0 0.254,0.254 0,0.254
Mechanical 16:
  rectangle: -1,-1 0,0
  lines w0.125: -1,-1 1,-1 1,0.9 1,1 -1,1 -1,-1

## SOT1061D [mm]
pads (3):
  rect 0.4x0.6 smd: 1(-0.65,-0.85) 2(0.65,-0.85)
  rect 0x0 smd: 3(0,0.975)
Top Layer:
  region: 0,0 0.254,0 0.254,0.254 0,0.254
Top Overlay:
  lines w0.125: -1,-1 -1,1 -0.375,1 ; -0.25,-1 0.25,-1 ; 0.375,1 1,1 1,-1
Top Paste:
  rectangle: -0.8,-1.1 -0.5,-0.6
  rectangle: 0.5,-1.1 0.8,-0.6
  region: 0,0 0.254,0 0.254,0.254 0,0.254
Top Solder:
  rectangle: -0.9,-1.2 -0.4,-0.5
  rectangle: 0.4,-1.2 0.9,-0.5
  region: 0,0 0.254,0 0.254,0.254 0,0.254
Mechanical 16:
  rectangle: -1,-1 0,0
  lines w0.125: -1,-1 1,-1 1,1 -1,1 -1,-1

## SOT1063-1 [mm]
pads (48):
  rrect100% 0.25x0.25 smd: A1(-1.4,1.4) A2(-1,1.4) A3(-0.6,1.4) A4(-0.2,1.4) A5(0.2,1.4) A6(0.6,1.4) A7(1,1.4) A8(1.4,1.4) B1(-1.4,1) B2(-1,1) B3(-0.6,1) B4(-0.2,1) B5(0.2,1) B6(0.6,1) B7(1,1) B8(1.4,1) C1(-1.4,0.6) C2(-1,0.6) C7(1,0.6) C8(1.4,0.6) D1(-1.4,0.2) D2(-1,0.2) D7(1,0.2) D8(1.4,0.2) E1(-1.4,-0.2) E2(-1,-0.2) E7(1,-0.2) E8(1.4,-0.2) F1(-1.4,-0.6) F2(-1,-0.6) F7(1,-0.6) F8(1.4,-0.6) G1(-1.4,-1) G2(-1,-1) G3(-0.6,-1) G4(-0.2,-1) G5(0.2,-1) G6(0.6,-1) G7(1,-1) G8(1.4,-1) H1(-1.4,-1.4) H2(-1,-1.4) H3(-0.6,-1.4) H4(-0.2,-1.4) H5(0.2,-1.4) H6(0.6,-1.4) H7(1,-1.4) H8(1.4,-1.4)
Top Overlay:
  lines w0.127: -2,-2 -2,2 2,2 2,-2 -2,-2
Top Paste:
  circle w0: c-1.4,1.4 r0.137
  circle w0: c-1,1.4 r0.137
  circle w0: c-0.6,1.4 r0.137
  circle w0: c-0.2,1.4 r0.137
  circle w0: c0.2,1.4 r0.137
  circle w0: c0.6,1.4 r0.137
  circle w0: c1,1.4 r0.137
  circle w0: c1.4,1.4 r0.137
  circle w0: c-1.4,1 r0.137
  circle w0: c-1,1 r0.137
  circle w0: c-0.6,1 r0.137
  circle w0: c-0.2,1 r0.137
  circle w0: c0.2,1 r0.137
  circle w0: c0.6,1 r0.137
  circle w0: c1,1 r0.137
  circle w0: c1.4,1 r0.137
  circle w0: c-1.4,-1 r0.137
  circle w0: c-1,-1 r0.137
  circle w0: c-0.6,-1 r0.137
  circle w0: c-0.2,-1 r0.137
  circle w0: c0.2,-1 r0.137
  circle w0: c0.6,-1 r0.137
  circle w0: c1,-1 r0.137
  circle w0: c1.4,-1 r0.137
  circle w0: c-1.4,-1.4 r0.137
  circle w0: c-1,-1.4 r0.137
  circle w0: c-0.6,-1.4 r0.137
  circle w0: c-0.2,-1.4 r0.137
  circle w0: c0.2,-1.4 r0.137
  circle w0: c0.6,-1.4 r0.137
  circle w0: c1,-1.4 r0.137
  circle w0: c1.4,-1.4 r0.137
  circle w0: c-1.4,0.6 r0.137
  circle w0: c-1,0.6 r0.137
  circle w0: c-1.4,0.2 r0.137
  circle w0: c-1,0.2 r0.137
  circle w0: c-1.4,-0.2 r0.137
  circle w0: c-1,-0.2 r0.137
  circle w0: c-1.4,-0.6 r0.137
  circle w0: c-1,-0.6 r0.137
  circle w0: c1,0.6 r0.137
  circle w0: c1.4,0.6 r0.137
  circle w0: c1,0.2 r0.137
  circle w0: c1.4,0.2 r0.137
  circle w0: c1,-0.2 r0.137
  circle w0: c1.4,-0.2 r0.137
  circle w0: c1,-0.6 r0.137
  circle w0: c1.4,-0.6 r0.137
Top Solder:
  circle w0: c-1.4,1.4 r0.175
  circle w0: c-1,1.4 r0.175
  circle w0: c-0.6,1.4 r0.175
  circle w0: c-0.2,1.4 r0.175
  circle w0: c0.2,1.4 r0.175
  circle w0: c0.6,1.4 r0.175
  circle w0: c1,1.4 r0.175
  circle w0: c1.4,1.4 r0.175
  circle w0: c-1.4,1 r0.175
  circle w0: c-1,1 r0.175
  circle w0: c-0.6,1 r0.175
  circle w0: c-0.2,1 r0.175
  circle w0: c0.2,1 r0.175
  circle w0: c0.6,1 r0.175
  circle w0: c1,1 r0.175
  circle w0: c1.4,1 r0.175
  circle w0: c-1.4,0.6 r0.175
  circle w0: c-1.4,0.2 r0.175
  circle w0: c-1.4,-0.2 r0.175
  circle w0: c-1.4,-0.6 r0.175
  circle w0: c-1.4,-1 r0.175
  circle w0: c-1.4,-1.4 r0.175
  circle w0: c-1,0.6 r0.175
  circle w0: c-1,0.2 r0.175
  circle w0: c-1,-0.2 r0.175
  circle w0: c-1,-0.6 r0.175
  circle w0: c-1,-1 r0.175
  circle w0: c-1,-1.4 r0.175
  circle w0: c-0.6,-1 r0.175
  circle w0: c-0.6,-1.4 r0.175
  circle w0: c-0.2,-1 r0.175
  circle w0: c-0.2,-1.4 r0.175
  circle w0: c0.2,-1 r0.175
  circle w0: c0.2,-1.4 r0.175
  circle w0: c0.6,-1 r0.175
  circle w0: c0.6,-1.4 r0.175
  circle w0: c1,-1 r0.175
  circle w0: c1,-1.4 r0.175
  circle w0: c1.4,-1 r0.175
  circle w0: c1.4,-1.4 r0.175
  circle w0: c1,0.6 r0.175
  circle w0: c1,0.2 r0.175
  circle w0: c1.4,0.6 r0.175
  circle w0: c1.4,0.2 r0.175
  circle w0: c1,-0.2 r0.175
  circle w0: c1,-0.6 r0.175
  circle w0: c1.4,-0.2 r0.175
  circle w0: c1.4,-0.6 r0.175
Mechanical 16:
  rectangle: -2,1 -1,2

## SOT1069-2 [mm]
pads (9):
  rect 0.25x0.625 smd: 1(-0.75,-1.412) 2(-0.25,-1.412) 3(0.25,-1.412) 4(0.75,-1.412) 5(0.75,1.412) 6(0.25,1.412) 7(-0.25,1.412) 8(-0.75,1.412)
  rect 1.6x1.6 smd: GP(0,0)
Top Overlay:
  circle w0: c-0.865,-2.2 r0.2
  lines w0.127: -1,-0.875 -1,0.875 ; 1,-0.875 1,0.875
Top Paste:
  rectangle: -0.3,-0.3 0.3,0.3
Mechanical 16:
  lines w0.127: -1,-1.5 1,-1.5 1,1.5 -1,1.5 -1,-1.5
  text "SOT1069" at -0.625,-2.125 h0.17